# Altium footprint library 常用PCB元件库.PcbLib: 71 footprints (part 1 of 5)
Each footprint in its own frame and in the unit in brackets; x right, y up, seen from the top. Pads: shape width x height; smd on the part's side, far side on the other; paste and mask are expansions set on the pad; w line width, h text height; cw(c..) or ccw(c..) is an arc to the next point about the centre after c.
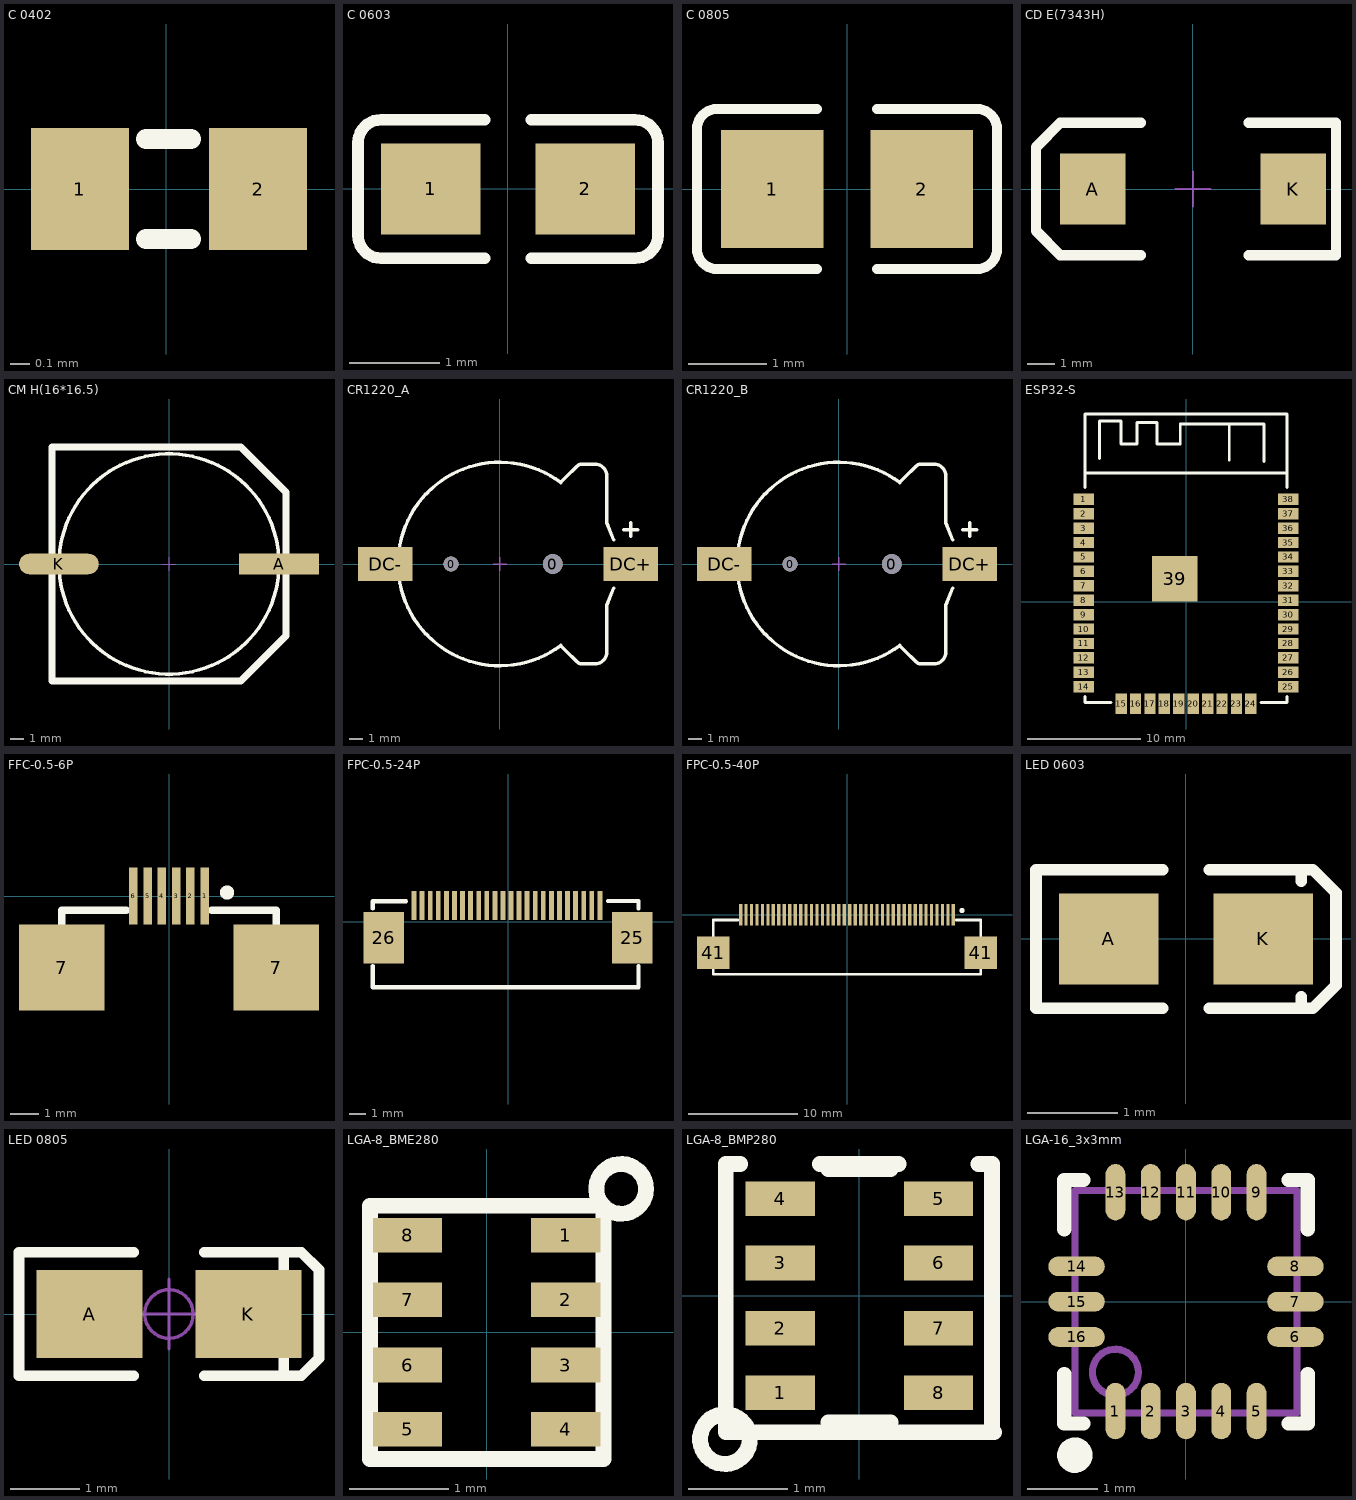
[diagram p0: the footprints below, top view; thin cyan lines are the x and y axes]

## C 0402 [mm] "Chip Capacitor, 2-Leads, Body 1.00x0.50mm, IPC Medium Density"
height 0.5
pads (2):
  rect 0.5x0.62 smd: 1(-0.44,0) 2(0.47,0)
Top Overlay:
  lines w0.102: -0.102,-0.254 0.127,-0.254 ; -0.102,0.254 0.127,0.254
3D body "CAPCP1005X05N.step": height 0.5, standoff 0, extent -0.525,-0.275 0.525,0.275

## C 0603 [mm] "贴片带丝印"
height 0.6
pads (2):
  rect 1.1x1 smd: 1(-0.85,0) 2(0.85,0)
Top Overlay:
  lines w0.127: -0.254,-0.762 -1.397,-0.762 cw(c-1.397,-0.508) -1.651,-0.508 -1.651,0.508 cw(c-1.397,0.508) -1.397,0.762 -0.254,0.762 ; 0.254,-0.762 1.397,-0.762 ccw(c1.397,-0.508) 1.651,-0.508 1.651,0.508 ccw(c1.397,0.508) 1.397,0.762 0.254,0.762
3D body "User Library-Chip Capacitor2.step": height 0.81, standoff 0.01, extent -0.8,-0.432 0.8,0.428

## C 0805 [mm] "贴片带丝印"
height 1.1
pads (2):
  rect 1.3x1.5 smd: 1(-0.95,0) 2(0.95,0)
Top Overlay:
  lines w0.127: -0.381,-1.016 -1.651,-1.016 cw(c-1.651,-0.762) -1.905,-0.762 -1.905,0.762 cw(c-1.651,0.762) -1.651,1.016 -0.381,1.016 ; 0.381,-1.016 1.651,-1.016 ccw(c1.651,-0.762) 1.905,-0.762 1.905,0.762 ccw(c1.651,0.762) 1.651,1.016 0.381,1.016
3D body "C 0805.STEP": height 0.51, standoff -0.01, extent -1,-0.61 1,0.61

## CD E(7343H) [mm] "长7.3mm，宽4.3mm，厚4.0mm"
pads (2):
  rect 2.4x2.6 smd: A(-3.65,0) K(3.65,0)
Top Overlay:
  lines w0.381: -1.905,-2.413 -4.826,-2.413 -5.715,-1.524 -5.715,1.524 -4.826,2.413 -1.905,2.413 ; 2.032,-2.413 5.207,-2.413 5.207,2.413 2.032,2.413
Mechanical 15:
  lines w0.076: -0.635,0 0.635,0 ; 0,-0.635 0,0.635
3D body "CD E(7343H).STEP": height 4, standoff -0.01, extent -3.65,-2.15 3.65,2.15

## CM H(16*16.5) [mm] "贴片电解电容，直径16mm，高16.5mm"
pads (2):
  rect 5.8x1.5 smd: A(8.001,0)
  oval 5.8x1.5 smd: K(-8.001,0)
Top Overlay:
  circle w0.254: c0,0 r8
  lines w0.508: -8.5,-8.5 -8.5,8.5 5.216,8.5 8.5,5.216 8.5,-5.216 5.216,-8.5 -8.5,-8.5
Mechanical 15:
  lines w0.076: -0.508,0 0.508,0 ; 0,-0.508 0,0.508
3D body "CM H(16X16.5).STEP": height 16.5, standoff -0.01, extent -9.4,-8.5 9.4,8.5

## CR1220_A [mm] "纽扣电池座"
pads (4):
  round 1.1 hole 1.1: 0(-3.6,0)
  round 1.45 hole 1.45: 0(3.9,0)
  rect 4x2.5 smd: DC+(9.652,0) DC-(-8.458,0)
Top Overlay:
  lines w0.254: 4.5,-6 cw(c0,0) 4.5,6 ; 4.572,-6.096 4.826,-6.35 5.662,-7.186 ccw(c6.096,-6.753) 6.096,-7.366 7.007,-7.366 ccw(c7.007,-6.499) 7.874,-6.499 7.874,-3.048 8.382,-1.778 ; 4.572,6.096 4.826,6.35 5.662,7.186 cw(c6.096,6.753) 6.096,7.366 7.007,7.366 cw(c7.007,6.499) 7.874,6.499 7.874,3.048 8.382,1.778 ; 9.144,2.54 10.16,2.54 ; 9.652,2.032 9.652,3.048
Mechanical 15:
  lines w0.1: -0.508,0 0.508,0 ; 0,-0.508 0,0.508
3D body "CR1220_A.STEP": height 4.05, standoff -0.85, extent -9.416,-7.45 10.34,7.45

## CR1220_B [mm] "纽扣电池座"
pads (4):
  round 1.1 hole 1.1: 0(-3.6,0)
  round 1.45 hole 1.45: 0(3.9,0)
  rect 4x2.5 smd: DC+(9.652,0) DC-(-8.458,0)
Top Overlay:
  lines w0.254: 4.5,-6 cw(c0,0) 4.5,6 ; 4.572,-6.096 4.826,-6.35 5.662,-7.186 ccw(c6.096,-6.753) 6.096,-7.366 7.007,-7.366 ccw(c7.007,-6.499) 7.874,-6.499 7.874,-3.048 8.382,-1.778 ; 4.572,6.096 4.826,6.35 5.662,7.186 cw(c6.096,6.753) 6.096,7.366 7.007,7.366 cw(c7.007,6.499) 7.874,6.499 7.874,3.048 8.382,1.778 ; 9.144,2.54 10.16,2.54 ; 9.652,2.032 9.652,3.048
Mechanical 15:
  lines w0.1: -0.508,0 0.508,0 ; 0,-0.508 0,0.508
3D body "CR1220_B.STEP": height 4.05, standoff -0.85, extent -9.416,-7.45 10.34,7.45

## ESP32-S [mm]
pads (39):
  rect 1.8x1 smd: 1(-9,9.005) 2(-9,7.735) 3(-9,6.465) 4(-9,5.195) 5(-9,3.925) 6(-9,2.655) 7(-9,1.385) 8(-9,0.115) 9(-9,-1.155) 10(-9,-2.425) 11(-9,-3.695) 12(-9,-4.965) 13(-9,-6.235) 14(-9,-7.505) 25(9,-7.505) 26(9,-6.235) 27(9,-4.965) 28(9,-3.695) 29(9,-2.425) 30(9,-1.155) 31(9,0.115) 32(9,1.385) 33(9,2.655) 34(9,3.925) 35(9,5.195) 36(9,6.465) 37(9,7.735) 38(9,9.005)
  rect 1x1.8 smd: 15(-5.715,-9.005) 16(-4.445,-9.005) 17(-3.175,-9.005) 18(-1.905,-9.005) 19(-0.635,-9.005) 20(0.635,-9.005) 21(1.905,-9.005) 22(3.175,-9.005) 23(4.445,-9.005) 24(5.715,-9.005)
  rect 4x4 smd: 39(-1,1.995)
Top Overlay:
  lines w0.254: -8.89,-8.37 -8.89,-8.89 -6.604,-8.89 ; -8.89,10.045 -8.89,16.51 8.89,16.51 8.89,10.045 ; -8.89,11.315 8.89,11.315 ; -7.62,12.584 -7.62,15.886 -5.715,15.886 -5.715,13.854 -4.318,13.854 -4.318,15.759 -2.54,15.759 -2.54,13.854 -0.508,13.854 -0.508,15.632 6.858,15.632 6.858,12.33 ; 3.81,12.458 3.81,15.633 ; 6.604,-8.89 8.89,-8.89 8.89,-8.37
3D body "User Library-ESP321.step": height 2.91, standoff -0.01, extent -9,-8.94 9,16.56

## FFC-0.5-6P [mm]
height 1
pads (8):
  rect 0.3x2 smd: 1(1.25,0) 2(0.75,0) 3(0.25,0) 4(-0.25,0) 5(-0.75,0) 6(-1.25,0)
  rect 3x3 smd: 7(-3.75,-2.5) 7(3.75,-2.5)
Top Overlay:
  circle w0.25: c2.032,0.127 r0.125
  lines w0.254: -3.75,-1.99 -3.75,-0.49 -1.5,-0.49 ; 1.5,-0.49 3.75,-0.49 3.75,-1.99
3D body "User Library-FFC 6x05-1.step": height 2.1, standoff 0, extent -4.35,-5.77 4.35,0.93

## FPC-0.5-24P [mm]
pads (26):
  rect 0.3x1.8 smd: 1(-5.815,1.008) 2(-5.315,1.008) 3(-4.815,1.008) 4(-4.315,1.008) 5(-3.815,1.008) 6(-3.315,1.008) 7(-2.815,1.008) 8(-2.315,1.008) 9(-1.815,1.008) 10(-1.315,1.008) 11(-0.815,1.008) 12(-0.315,1.008) 13(0.185,1.008) 14(0.685,1.008) 15(1.185,1.008) 16(1.685,1.008) 17(2.185,1.008) 18(2.685,1.008) 19(3.185,1.008) 20(3.685,1.008) 21(4.185,1.008) 22(4.685,1.008) 23(5.185,1.008) 24(5.685,1.008)
  rect 2.5x3.2 smd: 25(7.685,-0.992) 26(-7.685,-1.008)
Top Overlay:
  lines w0.254: -8.375,-2.742 -8.375,-4.064 8.087,-4.064 8.087,-2.737 ; -8.375,0.808 -8.375,1.258 -6.315,1.258 ; 6.194,1.263 8.087,1.263 8.087,0.813 ; 8.076,-3.742 ccw(c8.076,-3.726) 8.087,-3.737
3D body "affc20-24-050-sht-r.stp": height 2.04, standoff 0, extent -8.763,-4.097 8.737,1.303

## FPC-0.5-40P [mm]
height 1
pads (42):
  rect 0.3x2 smd: 1(9.75,0) 2(9.25,0) 3(8.75,0) 4(8.25,0) 5(7.75,0) 6(7.25,0) 7(6.75,0) 8(6.25,0) 9(5.75,0) 10(5.25,0) 11(4.75,0) 12(4.25,0) 13(3.75,0) 14(3.25,0) 15(2.75,0) 16(2.25,0) 17(1.75,0) 18(1.25,0) 19(0.75,0) 20(0.25,0) 21(-0.25,0) 22(-0.75,0) 23(-1.25,0) 24(-1.75,0) 25(-2.25,0) 26(-2.75,0) 27(-3.25,0) 28(-3.75,0) 29(-4.25,0) 30(-4.75,0) 31(-5.25,0) 32(-5.75,0) 33(-6.25,0) 34(-6.75,0) 35(-7.25,0) 36(-7.75,0) 37(-8.25,0) 38(-8.75,0) 39(-9.25,0) 40(-9.75,0)
  rect 3x3 smd: 41(-12.25,-3.49) 41(12.25,-3.49)
Top Overlay:
  circle w0.25: c10.541,0.381 r0.125
  lines w0.254: -12.25,-4.99 -12.25,-5.461 12.25,-5.461 12.25,-4.99 ; -12.25,-1.99 -12.25,-0.49 -10,-0.49 ; 10,-0.49 12.25,-0.49 12.25,-1.99
3D body "ffc_fpc_affc20-40-050-shb-t.stp": height 2.05, standoff -0.05, extent -12.75,-5.5 12.75,-0.164

## LED 0603 [mm]
height 0.6
pads (2):
  rect 1.1x1 smd: A(-0.85,0) K(0.85,0)
Top Overlay:
  lines w0.127: -0.254,-0.762 -1.651,-0.762 -1.651,0.762 -0.254,0.762 ; 0.254,-0.762 1.397,-0.762 1.651,-0.508 1.651,0.508 1.397,0.762 0.254,0.762 ; 1.27,-0.762 1.27,-0.635 ; 1.27,0.635 1.27,0.762
3D body "User Library-LED-0603-W.step": height 0.6, standoff 0, extent -0.8,-0.4 0.8,0.4

## LED 0805 [mil]
pads (2):
  rect 60x50 smd: A(-45,0) K(45,0)
Top Overlay:
  lines w6: -20,-35 -85,-35 -85,35 -20,35 ; 20,-35 75,-35 85,-25 85,25 75,35 20,35 ; 65,-35 65,-25 ; 65,25 65,35
Mechanical 15:
  circle w1.97: c0,0 r13.78
  lines w1.97: -19.68,0 19.68,0 ; 0,-19.68 0,19.68
3D body "LED 0805玻璃罩.STEP": height 31.69, standoff 12.01, extent -29.49,-24.65 29.49,24.65
3D body "LED 0805-G.STEP": height 26.33, standoff -0.16, extent -39.37,-24.65 39.37,24.65

## LGA-8_BME280 [mil]
pads (8):
  rect 27.56x13.8 smd: 1(31.5,38.6) 2(31.5,13) 3(31.5,-13) 4(31.5,-38.6) 5(-31.5,-38.6) 6(-31.5,-13) 7(-31.5,13) 8(-31.5,38.6)
Top Overlay:
  circle w6.3: c53.5,57.1 r9.9
  lines w6.3: -46.46,-50.39 46.46,-50.39 46.46,50.39 -46.46,50.39 -46.46,-50.39
3D body "User Library-Bosch_BME280.step": height 36.61, standoff -0.01, extent -49.21,-49.21 49.21,49.21

## LGA-8_BMP280 [mil]
pads (8):
  rect 27.56x13.8 smd: 1(-31.5,-38.6) 2(-31.5,-13) 3(-31.5,13) 4(-31.5,38.6) 5(31.5,38.6) 6(31.5,13) 7(31.5,-13) 8(31.5,-38.6)
Top Overlay:
  circle w6.3: c-53.5,-57.1 r9.9
  lines w6.3: -47.39,52.36 -53.15,52.36 -53.15,-54.33 53.54,-54.33 ; -15.61,52.36 15.61,52.36 ; -12.4,-50.39 12.4,-50.39 ; -12.4,50.39 12.4,50.39 ; 47.39,52.36 52.76,52.36 52.76,-54.33
3D body "User Library-BST-BMP280.step": height 39.37, standoff 0, extent -39.37,-49.21 39.37,49.22

## LGA-16_3x3mm [mm]
pads (16):
  oval 0.28x0.8 smd mask+0.051: 1(-1,-1.55) 2(-0.5,-1.55) 3(0,-1.55) 4(0.5,-1.55) 5(1,-1.55) 9(1,1.55) 10(0.5,1.55) 11(0,1.55) 12(-0.5,1.55) 13(-1,1.55)
  oval 0.8x0.28 smd mask+0.051: 6(1.55,-0.5) 7(1.55,0) 8(1.55,0.5) 14(-1.55,0.5) 15(-1.55,0) 16(-1.55,-0.5)
Top Overlay:
  circle w0.25: c-1.575,-2.175 r0.125
  lines w0.2: -1.725,-1.025 -1.725,-1.725 -1.45,-1.725 ; -1.725,1.025 -1.725,1.725 -1.45,1.725 ; 1.45,-1.725 1.725,-1.725 1.725,-1.025 ; 1.45,1.725 1.725,1.725 1.725,1.025
Mechanical 13:
  circle w0.1: c-1,-1 r0.326
  lines w0.1: -1.575,-1.575 1.575,-1.575 1.575,1.575 -1.575,1.575 -1.575,-1.575